# Altium footprint library PcbLib1.PcbLib: 47 footprints (part 2 of 3)
Each footprint in its own frame and in the unit in brackets; x right, y up, seen from the top. Pads: shape width x height; smd on the part's side, far side on the other; paste and mask are expansions set on the pad; w line width, h text height; cw(c..) or ccw(c..) is an arc to the next point about the centre after c.
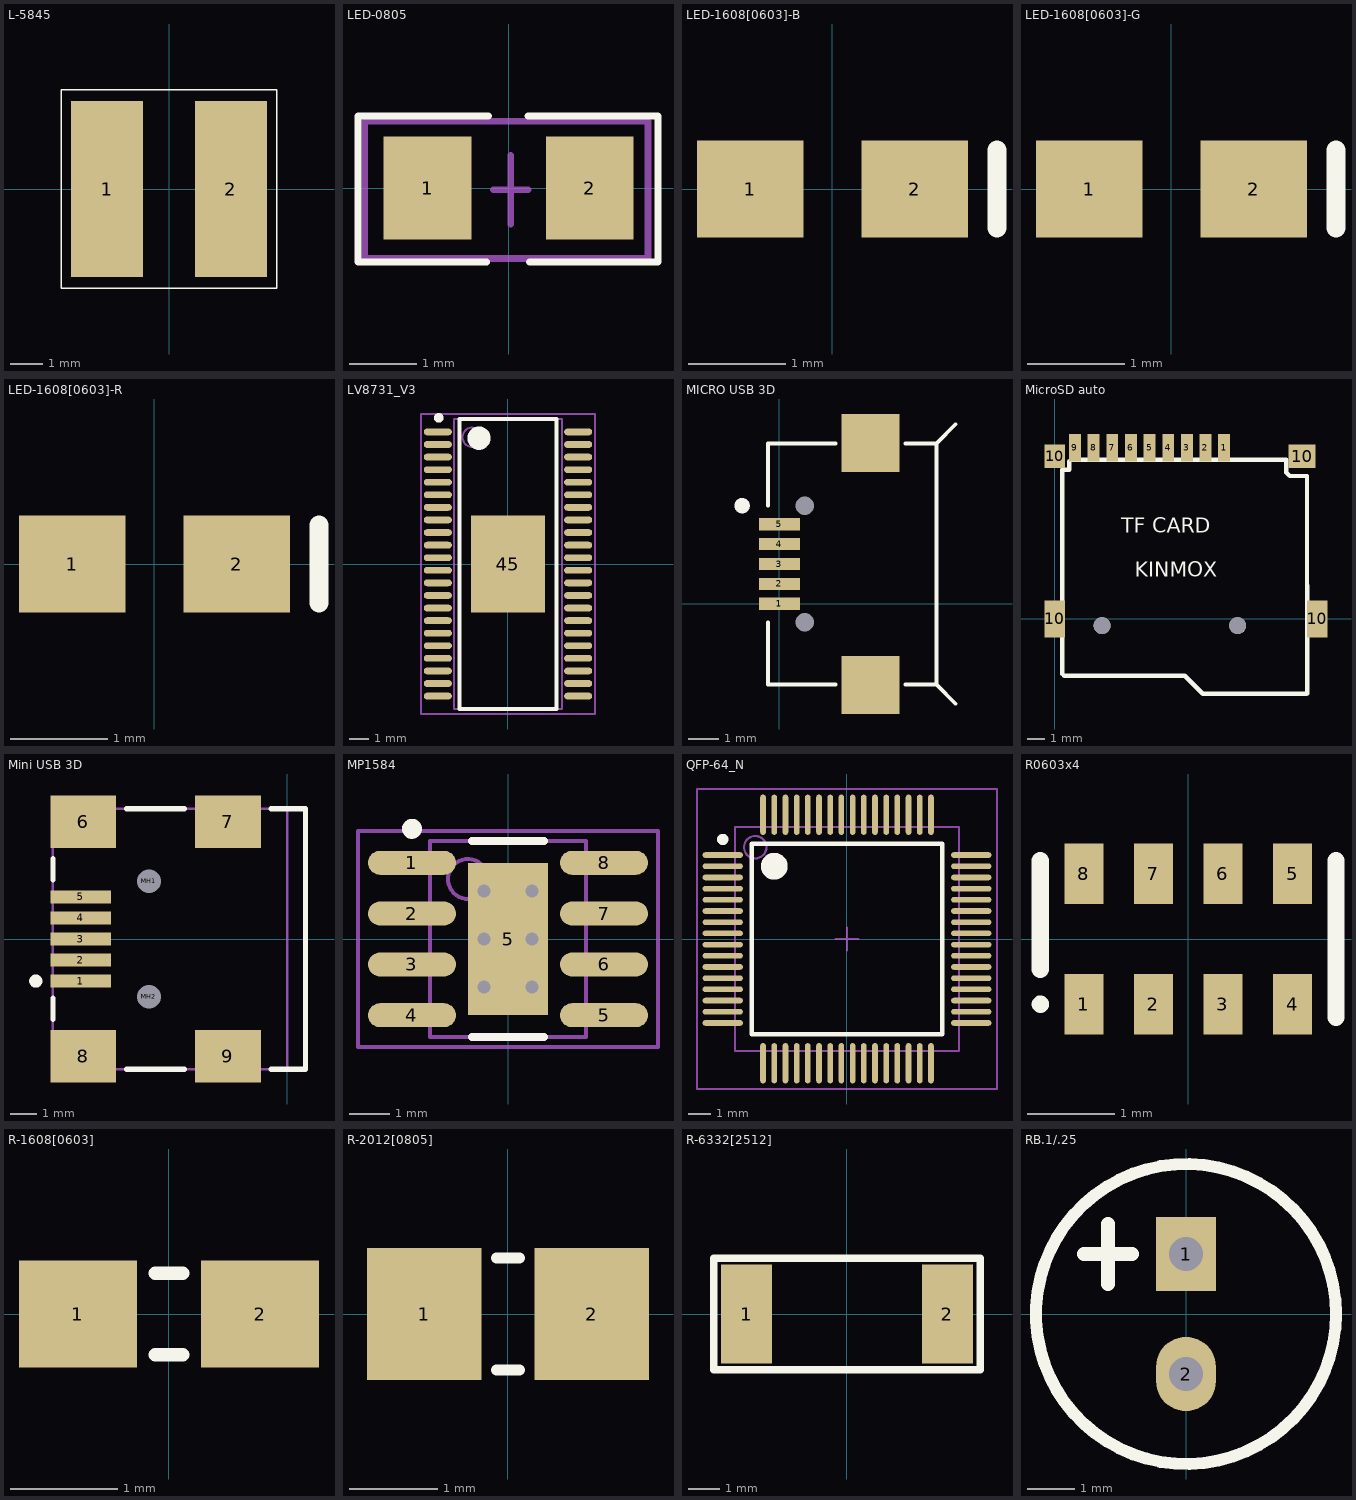
[diagram p1: the footprints below, top view; thin cyan lines are the x and y axes]

## L-5845 [mm]
pads (2):
  rect 2.2x5.4 smd: 1(-1.9,0) 2(1.9,0)
Top Overlay:
  lines w0.05: -3.302,-3.048 3.302,-3.048 3.302,3.048 -3.302,3.048 -3.302,-3.048

## LED-0805 [mm]
pads (2):
  rect 1.3x1.524 smd: 1(-1.2,0) 2(1.2,0)
Top Overlay:
  lines w0.102: -0.324,-1.092 -2.229,-1.092 -2.229,1.067 -0.298,1.067 ; 0.286,1.067 2.21,1.067 2.21,-1.092 0.311,-1.092
Mechanical 15:
  lines w0.1: -0.222,-0.025 0.286,-0.025 ; 0.032,-0.533 0.032,0.483 ; -2.127,-1.041 -2.127,0.991 2.064,0.991 2.064,-1.041 -2.127,-1.041
3D body: height 1.07, standoff -0.03, extent -1.6,-0.8 1.6,0.8

## LED-1608[0603]-B [mm] "Chip Diode; Body 1.6 x 0.8 mm (LxW typ)"
height 0.85
pads (2):
  rect 1.1x1 smd: 1(-0.85,0) 2(0.85,0)
Top Overlay:
  lines w0.2: 1.7,-0.4 1.7,0.4
3D body: height 0.9, standoff 0, extent -0.85,-0.443 0.85,0.457

## LED-1608[0603]-G [mm] "Chip Diode; Body 1.6 x 0.8 mm (LxW typ)"
height 0.85
pads (2):
  rect 1.1x1 smd: 1(-0.85,0) 2(0.85,0)
Top Overlay:
  lines w0.2: 1.7,-0.4 1.7,0.4
3D body: height 0.9, standoff 0, extent -0.85,-0.443 0.85,0.457

## LED-1608[0603]-R [mm] "Chip Diode; Body 1.6 x 0.8 mm (LxW typ)"
height 0.85
pads (2):
  rect 1.1x1 smd: 1(-0.85,0) 2(0.85,0)
Top Overlay:
  lines w0.2: 1.7,-0.4 1.7,0.4
3D body: height 0.9, standoff 0, extent -0.825,-0.443 0.875,0.457

## LV8731_V3 [mm] "SOP, 44-Leads, Body 15.0x5.6mm (max), Pitch 0.65mm, IPC Medium Density"
height 1.7
pads (45):
  oval 1.45x0.35 smd: 1(-3.625,6.825) 2(-3.625,6.175) 3(-3.625,5.525) 4(-3.625,4.875) 5(-3.625,4.225) 6(-3.625,3.575) 7(-3.625,2.925) 8(-3.625,2.275) 9(-3.625,1.625) 10(-3.625,0.975) 11(-3.625,0.325) 12(-3.625,-0.325) 13(-3.625,-0.975) 14(-3.625,-1.625) 15(-3.625,-2.275) 16(-3.625,-2.925) 17(-3.625,-3.575) 18(-3.625,-4.225) 19(-3.625,-4.875) 20(-3.625,-5.525) 21(-3.625,-6.175) 22(-3.625,-6.825) 23(3.625,-6.825) 24(3.625,-6.175) 25(3.625,-5.525) 26(3.625,-4.875) 27(3.625,-4.225) 28(3.625,-3.575) 29(3.625,-2.925) 30(3.625,-2.275) 31(3.625,-1.625) 32(3.625,-0.975) 33(3.625,-0.325) 34(3.625,0.325) 35(3.625,0.975) 36(3.625,1.625) 37(3.625,2.275) 38(3.625,2.925) 39(3.625,3.575) 40(3.625,4.225) 41(3.625,4.875) 42(3.625,5.525) 43(3.625,6.175) 44(3.625,6.825)
  rect 3.8x5 smd: 45(0,0)
Top Overlay:
  circle w0.25: c-3.575,7.55 r0.125
  circle w0.6: c-1.5,6.5 r0.3
  lines w0.2: -2.5,-7.5 -2.5,7.5 2.5,7.5 2.5,-7.5 -2.5,-7.5
Mechanical 13:
  circle w0.1: c-1.85,6.55 r0.5
  lines w0.1: -2.8,-7.5 -2.8,7.5 2.8,7.5 2.8,-7.5 -2.8,-7.5
Mechanical 15:
  lines w0.1: -0.5,0 0.5,0 ; 0,-0.5 0,0.5 ; -4.5,-7.75 -4.5,7.75 4.5,7.75 4.5,-7.75 -4.5,-7.75
3D body: height 1.7, standoff 0.2, extent -2.8,-7.5 2.8,7.5

## MICRO USB 3D [mm]
pads (9):
  rect 1.35x0.4 smd: 1(0,0) 2(0,0.65) 3(0,1.3) 4(0,1.95) 5(0,2.6)
  round 0 hole 0.6: HOLE(0.827,-0.6) HOLE(0.827,3.2)
  rect 1.9x1.9 smd: ""(2.977,-2.65) ""(2.977,5.25)
Top Overlay:
  circle w0.25: c-1.221,3.205 r0.125
  lines w0.127: -0.381,-2.637 1.825,-2.637 ; -0.381,-2.6 -0.381,-0.605 ; -0.381,3.205 -0.381,5.2 ; -0.381,5.237 1.825,5.237 ; 4.111,-2.637 5.127,-2.637 5.757,-3.267 ; 4.111,5.237 5.127,5.237 5.757,5.867 ; 5.127,-2.6 5.127,5.2
3D body: height 2.79, standoff -0.28, extent -0.291,-3.13 5.334,5.67

## MicroSD auto [mm] "TF 自弹"
pads (15):
  rect 0.7x1.6 smd: 1(10,10.1) 2(8.9,10.1) 3(7.8,10.1) 4(6.7,10.1) 5(5.6,10.1) 6(4.5,10.1) 7(3.4,10.1) 8(2.3,10.1) 9(1.2,10.1)
  rect 1.2x2.2 smd: 10(0,0) 10(15.5,0)
  rect 1.2x1.4 smd: 10(0,9.6)
  rect 1.6x1.4 smd: 10(14.6,9.6)
  round 1 hole 1: ""(2.8,-0.4) ""(10.8,-0.4)
Top Overlay:
  lines w0.254: 14.88,-4.42 8.738,-4.42 7.671,-3.353 0.559,-3.353 0.457,-3.251 0.457,8.793 0.864,8.793 0.864,9.296 0.965,9.398 13.665,9.398 13.665,8.636 13.868,8.433 14.884,8.433 14.9,-4.4
  text "KINMOX" at 4.724,2.489 h0.89
  text "TF CARD" at 3.937,5.08 h0.89
3D body: height 1.85, standoff -0.6, extent -0.38,-4.191 15.62,11.059

## Mini USB 3D [mm] "Connector; USB2.0, Type B, SM; 5 Position; Right Angle"
height 3.9
pads (11):
  rect 2.3x0.5 smd: 1(-7.85,-1.6) 2(-7.85,-0.8) 3(-7.85,0) 4(-7.85,0.8) 5(-7.85,1.6)
  rect 2.5x2 smd: 6(-7.75,4.45) 7(-2.25,4.45) 8(-7.75,-4.45) 9(-2.25,-4.45)
  round 0.6 hole 0.9 unplated: MH1(-5.25,2.2) MH2(-5.25,-2.2)
Top Overlay:
  circle w0.25: c-9.55,-1.6 r0.125
  lines w0.2: -8.9,-3.05 -8.9,-2.25 ; -8.9,2.25 -8.9,3.05 ; -6.1,-4.95 -3.9,-4.95 ; -6.1,4.95 -3.9,4.95 ; -0.6,-4.95 0.7,-4.95 0.7,4.95 -0.6,4.95
Mechanical 1:
  lines w0.1: 0,-4.95 0,4.95
  text "PCB Edge" at 0.432,-4.036 h0.76
Mechanical 13:
  lines w0.1: -8.9,-4.95 0.7,-4.95 0.7,4.95 -8.9,4.95 -8.9,-4.95
3D body: height 3.93, standoff -1, extent -8.488,-5.077 0.762,4.823

## MP1584 [mm] "SOIC, 8-Leads, Body 4.9x3.9mm (max), Pitch 1.27mm, IPC Medium Density"
height 1.7
pads (9):
  oval 2.2x0.6 smd: 1(-2.4,1.905) 2(-2.4,0.635) 3(-2.4,-0.635) 4(-2.4,-1.905) 5(2.4,-1.905) 6(2.4,-0.635) 7(2.4,0.635) 8(2.4,1.905)
  rect 2x3.8 smd: 5(0,0)
via -0.6,1.2 diameter 0.66 hole 0.33
via 0.6,1.2 diameter 0.66 hole 0.33
via -0.6,0 diameter 0.66 hole 0.33
via 0.6,0 diameter 0.66 hole 0.33
via -0.6,-1.2 diameter 0.66 hole 0.33
via 0.6,-1.2 diameter 0.66 hole 0.33
Top Overlay:
  circle w0.25: c-2.4,2.755 r0.125
  lines w0.2: -0.9,-2.45 0.9,-2.45 ; -0.9,2.45 0.9,2.45
Mechanical 13:
  circle w0.1: c-1,1.5 r0.5
  lines w0.1: -1.95,-2.45 -1.95,2.45 1.95,2.45 1.95,-2.45 -1.95,-2.45
Mechanical 15:
  lines w0.1: -0.5,0 0.5,0 ; 0,-0.5 0,0.5 ; -3.75,-2.7 -3.75,2.7 3.75,2.7 3.75,-2.7 -3.75,-2.7
3D body: height 1.7, standoff 0.15, extent -1.95,-2.45 1.95,2.45

## QFP-64_N [mm]
pads (64):
  oval 1.8x0.254 smd: 1(-5.55,3.75) 2(-5.55,3.25) 3(-5.55,2.75) 4(-5.55,2.25) 5(-5.55,1.75) 6(-5.55,1.25) 7(-5.55,0.75) 8(-5.55,0.25) 9(-5.55,-0.25) 10(-5.55,-0.75) 11(-5.55,-1.25) 12(-5.55,-1.75) 13(-5.55,-2.25) 14(-5.55,-2.75) 15(-5.55,-3.25) 16(-5.55,-3.75) 33(5.55,-3.75) 34(5.55,-3.25) 35(5.55,-2.75) 36(5.55,-2.25) 37(5.55,-1.75) 38(5.55,-1.25) 39(5.55,-0.75) 40(5.55,-0.25) 41(5.55,0.25) 42(5.55,0.75) 43(5.55,1.25) 44(5.55,1.75) 45(5.55,2.25) 46(5.55,2.75) 47(5.55,3.25) 48(5.55,3.75)
  oval 0.254x1.8 smd: 17(-3.75,-5.55) 18(-3.25,-5.55) 19(-2.75,-5.55) 20(-2.25,-5.55) 21(-1.75,-5.55) 22(-1.25,-5.55) 23(-0.75,-5.55) 24(-0.25,-5.55) 25(0.25,-5.55) 26(0.75,-5.55) 27(1.25,-5.55) 28(1.75,-5.55) 29(2.25,-5.55) 30(2.75,-5.55) 31(3.25,-5.55) 32(3.75,-5.55) 49(3.75,5.55) 50(3.25,5.55) 51(2.75,5.55) 52(2.25,5.55) 53(1.75,5.55) 54(1.25,5.55) 55(0.75,5.55) 56(0.25,5.55) 57(-0.25,5.55) 58(-0.75,5.55) 59(-1.25,5.55) 60(-1.75,5.55) 61(-2.25,5.55) 62(-2.75,5.55) 63(-3.25,5.55) 64(-3.75,5.55)
Top Overlay:
  circle w0.6: c-3.25,3.25 r0.3
  circle w0.25: c-5.55,4.45 r0.125
  lines w0.2: -4.25,-4.25 4.25,-4.25 4.25,4.25 -4.25,4.25 -4.25,-4.25
Mechanical 13:
  circle w0.1: c-4.1,4.1 r0.5
  lines w0.1: -5,-5 5,-5 5,5 -5,5 -5,-5
Mechanical 15:
  lines w0.1: -0.5,0 0.5,0 ; 0,-0.5 0,0.5 ; -6.7,-6.7 6.7,-6.7 6.7,6.7 -6.7,6.7 -6.7,-6.7
3D body: height 1.6, standoff 0, extent -5,-5 5,5

## R0603x4 [mm] "Chip Resistor Array, (0603x4); SM; 8 Leads; Body 3.40 x 1.80 mm (LxW max)"
height 0.7
pads (8):
  rect 0.45x0.7 smd: 1(-1.2,-0.75) 2(-0.4,-0.75) 3(0.4,-0.75) 4(1.2,-0.75) 5(1.2,0.75) 6(0.4,0.75) 7(-0.4,0.75) 8(-1.2,0.75)
Top Overlay:
  circle w0.1: c-1.7,-0.75 r0.05
  lines w0.2: -1.7,-0.35 -1.7,0.9 ; 1.7,-0.9 1.7,0.9
3D body: height 0.65, standoff 0, extent -1.6,-0.762 1.6,0.838

## R-1608[0603] [mm] "Chip Resistor; Body 1.6 x 0.8 mm (LxW typ)"
height 1.35
pads (2):
  rect 1.1x1 smd: 1(-0.85,0) 2(0.85,0)
Top Overlay:
  lines w0.127: -0.127,-0.381 0.127,-0.381 ; -0.127,0.381 0.127,0.381
3D body: height 0.48, standoff -0.05, extent -1.27,-0.508 1.33,0.492

## R-2012[0805] [mm] "Chip Resistor; Body 2.0 x 1.3 mm (LxW typ)"
height 0.65
pads (2):
  rect 1.3x1.5 smd: 1(-0.95,0) 2(0.95,0)
Top Overlay:
  lines w0.127: -0.127,-0.635 0.127,-0.635 ; -0.127,0.635 0.127,0.635
3D body: height -0.38, standoff -0.91, extent -1.5,-0.689 1.5,0.711

## R-6332[2512] [mm] "贴片电阻2512 size6.35*3.2mm"
height 0.65
pads (2):
  rect 1.65x3.2 smd: 1(-3.24,0) 2(3.24,0)
Top Overlay:
  lines w0.254: 4.3,-1.8 -4.3,-1.8 -4.3,1.8 4.3,1.8 ; 4.3,-1.75 4.3,1.75
3D body: height 0.6, standoff -0.04, extent -3.4,-1.651 3.4,1.649

## RB.1/.25 [mil]
pads (2):
  rect 50x62 hole 28: 1(0,50)
  oval 50x62 hole 28: 2(0,-50)
Top Overlay:
  circle w10: c0,0 r125
  lines w12: -85,50 -45,50 ; -65,25 -65,75